# Altium footprint library RL1.PCBLIB: 94 footprints (part 4 of 6)
Each footprint in its own frame and in the unit in brackets; x right, y up, seen from the top. Pads: shape width x height; smd on the part's side, far side on the other; paste and mask are expansions set on the pad; w line width, h text height; cw(c..) or ccw(c..) is an arc to the next point about the centre after c.
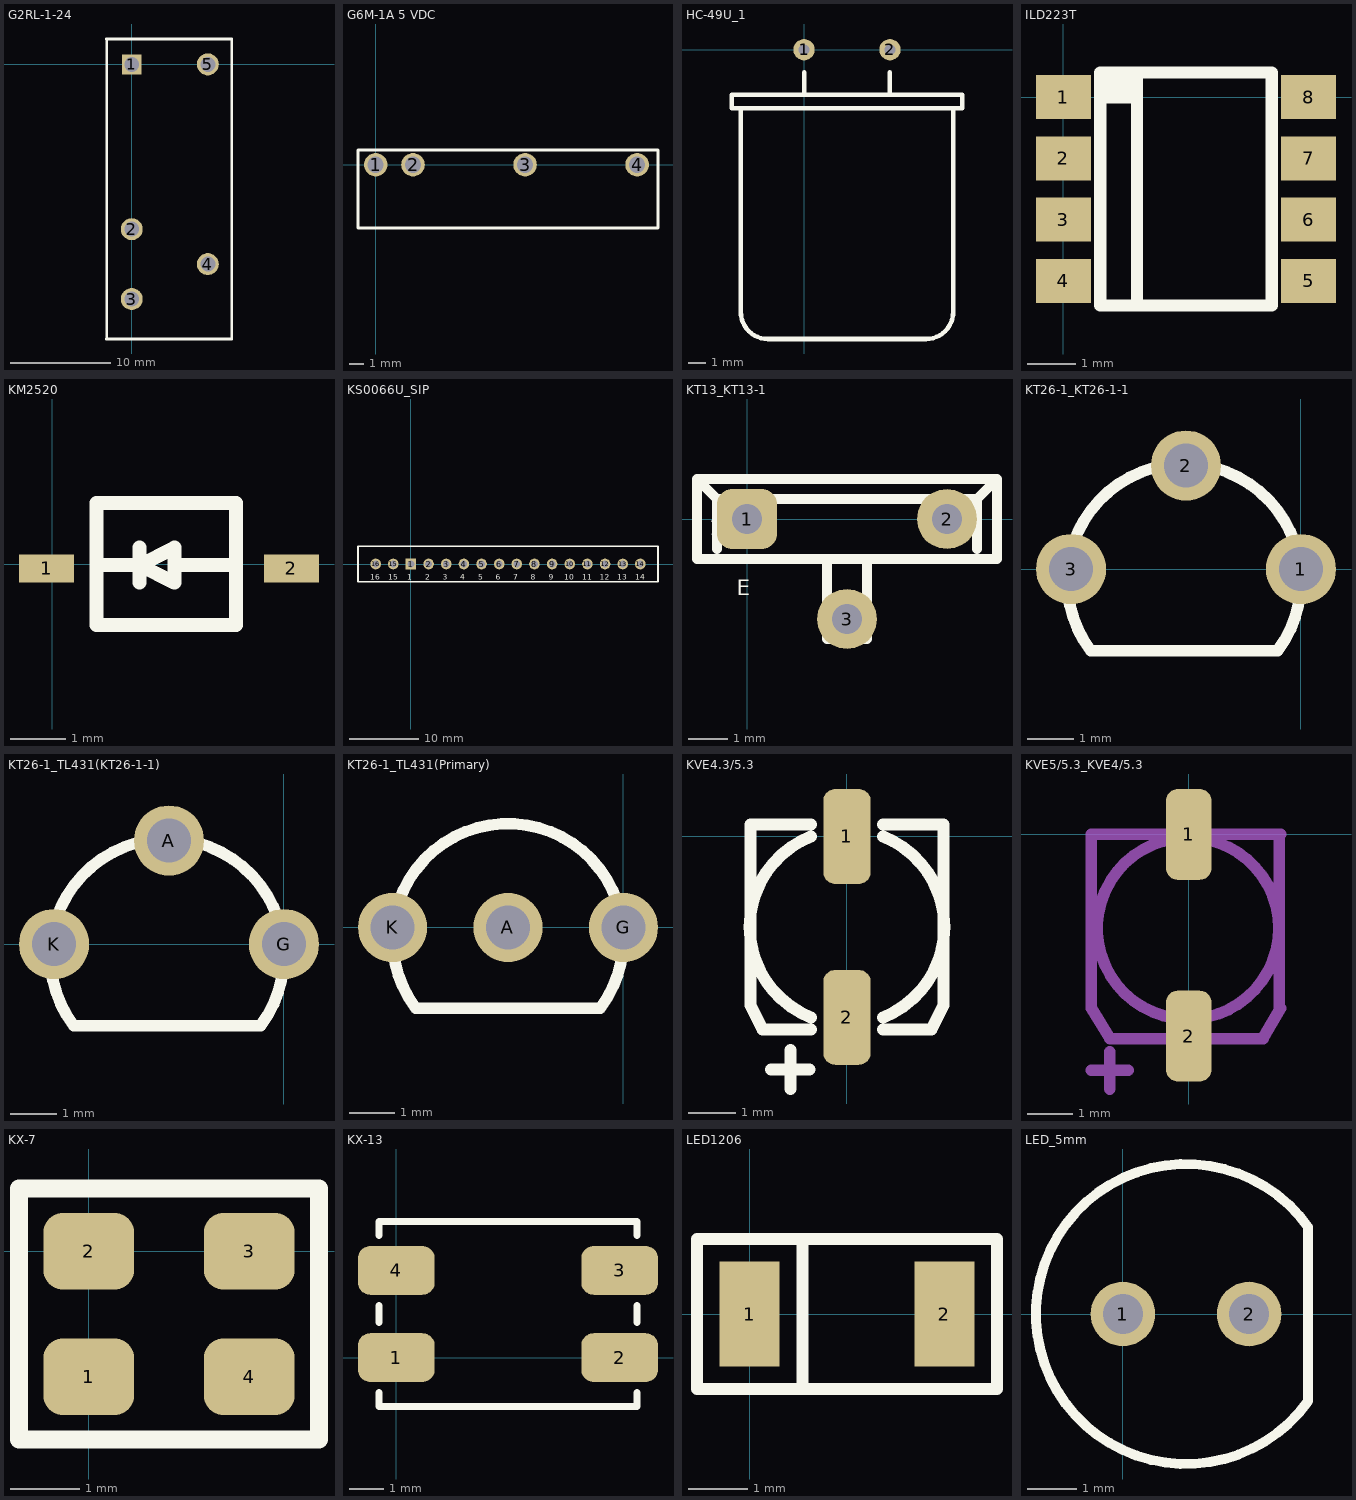
[diagram p3: the footprints below, top view; thin cyan lines are the x and y axes]

## G2RL-1-24 [mm]
pads (5):
  rect 2x2 hole 1.5: 1(0,0)
  round 2.2 hole 1.5: 2(0,-16.5) 3(0,-23.5) 4(7.62,-20.002) 5(7.62,0)
Top Overlay:
  lines w0.254: -2.54,-27.5 10,-27.5 10,2.5 ; -2.54,2.54 10,2.54 ; -2.5,-27.5 -2.5,2.5
Top Assembly:
  text ".Designator" at 8.728,-12.813 h1
3D body "g2rl-1a-h_24dc.stp": height 15.8, standoff -3.4, extent -2.595,-26.65 10.105,2.35

## G6M-1A 5 VDC [mm]
pads (4):
  round 1.6 hole 1.1: 1(0,0) 2(2.54,0) 3(10.16,0) 4(17.78,0)
Top Overlay:
  lines w0.2: -1.2,-4.3 -1.2,1 19.2,1 19.2,-4.3 -1.2,-4.3
Top Assembly:
  text ".Designator" at 13.998,-1.983 h1
3D body "g6m-1a_5dc.stp": height 17.7, standoff -3.3, extent -1.175,-4.24 19.125,0.84

## HC-49U_1 [mm]
pads (2):
  round 1.2 hole 0.6: 1(0,0) 2(4.826,0)
Top Overlay:
  lines w0.254: -3.556,-3.302 -3.556,-14.732 ccw(c-2.032,-14.732) -2.032,-16.256 6.858,-16.256 ccw(c6.858,-14.732) 8.382,-14.732 8.382,-3.302 ; 0,-2.54 0,-1.27 ; 4.826,-2.54 4.826,-1.27 ; -4.064,-3.302 -4.064,-2.54 8.89,-2.54 8.89,-3.302 -4.064,-3.302
Top Assembly:
  text ".Designator" at 7.411,-8.174 h1

## ILD223T [mm]
pads (8):
  rect 1.14x0.91 smd: 1(0,0) 2(0,-1.27) 3(0,-2.54) 4(0,-3.81) 5(5.08,-3.81) 6(5.08,-2.54) 7(5.08,-1.27) 8(5.08,0)
Top Overlay:
  region: 0.889,-0.127 1.524,-0.127 1.524,0.508 0.889,0.508
  lines w0.254: 1.524,-4.318 1.524,0.508 ; 0.762,-4.318 4.318,-4.318 4.318,0.508 0.762,0.508 0.762,-4.318
Top Assembly:
  text ".Designator" at 7.538,-2.238 h1

## KM2520 [mm]
pads (2):
  rect 1x0.5 smd: 1(-0.102,-0.08) 2(4.343,-0.08)
Top Overlay:
  lines w0.254: 0.95,-0.02 1.585,-0.02 ; 1.585,-0.337 1.585,0.298 ; 2.22,-0.02 3.173,-0.02 ; 3.3,-1.11 0.8,-1.11 0.8,1.112 3.3,1.112 ; 3.34,-1.11 3.34,1.112 ; 1.585,-0.02 2.22,0.298 2.22,-0.337 1.585,-0.02
Top Assembly:
  text ".Designator" at 7.118,-0.332 h1

## KS0066U_SIP [mil]
pads (16):
  rect 60x60 hole 38: 1(0,0)
  round 60 hole 38: 2(100,0) 3(200,0) 4(300,0) 5(400,0) 6(500,0) 7(600,0) 8(700,0) 9(800,0) 10(900,0) 11(1000,0) 12(1100,0) 13(1200,0) 14(1300,0) 15(-100,0) 16(-200,0)
Top Overlay:
  lines w10: -300,-100 -300,100 1400,100 1400,-100 -300,-100
  text "16" at -230,-90 h31.25
  text "1" at -20,-90 h31.25
  text "2" at 80,-90 h31.25
  text "4" at 280,-90 h31.25
  text "5" at 380,-90 h31.25
  text "7" at 580,-90 h31.25
  text "8" at 680,-90 h31.25
  text "10" at 870,-90 h31.25
  text "11" at 970,-90 h31.25
  text "13" at 1170,-90 h31.25
  text "14" at 1270,-90 h31.25
  text "3" at 180,-90 h31.25
  text "6" at 480,-90 h31.25
  text "15" at -130,-90 h31.25
  text "9" at 780,-90 h31.25
  text "12" at 1070,-90 h31.25
Top Assembly:
  text ".Designator" at 746.79,-13.12 h39.37

## KT13_KT13-1 [mil]
pads (3):
  rrect50% 60x60 hole 30: 1(0,0)
  round 60 hole 30: 2(200,0) 3(100,-100)
Top Overlay:
  lines w10: -30,-30 -30,20 ; 80,-40 80,-120 120,-120 120,-40 ; 230,-30 230,20 ; -50,40 250,40 ; -50,40 -50,-40 250,-40 250,40 ; -50,40 -30,20 ; -30,20 230,20 ; 230,20 250,40
  text "E" at -10.23,-76.48 h15.62
  text "1" at -37.89,-16.48 h15.62
Top Assembly:
  text ".Designator" at 296.79,-57.62 h39.37

## KT26-1_KT26-1-1 [mil]
pads (3):
  round 60 hole 38: 1(0,0) 2(-98.43,88.58) 3(-196.85,0)
Top Overlay:
  lines w10: -180,-70 -20,-70 ; -179.97,-70.04 cw(c-100,-10) -20.03,-70.04
Top Assembly:
  text ".Designator" at 98.36,10.65 h39.37

## KT26-1_TL431(KT26-1-1) [mil]
pads (3):
  round 60 hole 38: A(-98.43,88.58) G(0,0) K(-196.85,0)
Top Overlay:
  lines w10: -180,-70 -20,-70 ; -179.97,-70.04 cw(c-100,-10) -20.03,-70.04
Top Assembly:
  text ".Designator" at 98.36,10.65 h39.37

## KT26-1_TL431(Primary) [mil]
pads (3):
  round 60 hole 38: A(-100,0) G(0,0) K(-200,0)
Top Overlay:
  lines w10: -180,-70 -20,-70 ; -179.97,-70.04 cw(c-100,-10) -20.03,-70.04
Top Assembly:
  text ".Designator" at 96.79,-3.14 h39.37

## KVE4.3/5.3 [mm]
pads (2):
  rrect50% 1x2 smd: 1(0,0) 2(0,-3.81)
Top Overlay:
  lines w0.254: -1.6,-4.91 -0.79,-4.91 ; -1.19,-5.32 -1.19,-4.5 ; -0.762,-4.064 -1.778,-4.064 -2.032,-3.556 -2.032,0.254 -0.762,0.254 ; -0.762,-3.81 cw(c0,-1.905) -0.762,0 ; 0.762,-4.064 1.778,-4.064 2.032,-3.556 2.032,0.254 0.762,0.254 ; 0.762,-3.81 ccw(c0,-1.905) 0.762,0
Top Assembly:
  text ".Designator" at 4.998,-2.506 h1

## KVE5/5.3_KVE4/5.3 [mm]
pads (2):
  rrect50% 1x2 smd: 1(0,0) 2(0,-4.445)
Mechanical 1:
  circle w0.254: c-0.014,-2.07 r2
  lines w0.254: -2.145,-5.2 -1.335,-5.2 ; -2.144,-3.83 -1.734,-4.5 ; -2.144,-3.8 -2.144,0 ; -2.084,0 2.026,0 ; -1.735,-5.61 -1.735,-4.79 ; -1.704,-4.5 1.646,-4.5 ; 1.646,-4.47 2.026,-3.83 ; 1.996,-3.8 1.996,-0.03
Top Assembly:
  text ".Designator" at 4.939,-2.651 h1

## KX-7 [mm]
pads (4):
  rrect50% 1.3x1.1 smd: 1(0,-1.8) 2(0,0) 3(2.3,0) 4(2.3,-1.8)
Top Overlay:
  lines w0.254: -1,-2.7 -1,0.9 3.3,0.9 3.3,-2.7 -1,-2.7
Top Assembly:
  text ".Designator" at 6.148,-1.233 h1
3D body "GeyerElectronics_KX7.STEP": height 0.81, standoff 0, extent -0.457,-2.135 2.757,0.365

## KX-13 [mm]
pads (4):
  rrect50% 2.2x1.4 smd: 1(0,0) 2(6.4,0) 3(6.4,2.5) 4(0,2.5)
Top Overlay:
  lines w0.2: -0.5,-1 -0.5,-1.4 6.9,-1.4 6.9,-1 ; -0.5,1 -0.5,1.5 ; -0.5,3.5 -0.5,3.9 6.9,3.9 6.9,3.5 ; 6.9,1 6.9,1.5
Top Assembly:
  text ".Designator" at 8.198,0.917 h1

## LED1206 [mil]
pads (2):
  rect 40x70 smd: 1(0,0) 2(129.92,0)
Top Overlay:
  lines w7.87: 35.43,-47.24 35.43,47.24 ; -35,-50 165,-50 165,50 -35,50 -35,-50
Top Assembly:
  text ".Designator" at -51.13,-10.5 h31.5
3D body "User Library-led_1206LED1206 green.STEP": height 43.31, standoff 0, extent 1.57,-31.5 128.35,31.5

## LED_5mm [mm]
pads (2):
  round 1.3 hole 0.8: 1(0,0) 2(2.54,0)
Top Overlay:
  lines w0.2: 3.725,-1.753 3.725,1.753 ; 3.728,-1.755 cw(c1.27,0) 3.729,1.753
Top Assembly:
  text ".Designator" at 5.988,-0.333 h1
3D body "SW3dPS-LEDd5R.STEP": height 12.31, standoff -2.49, extent -1.71,-3.01 3.71,3.01